# Altium footprint library sun_library.PcbLib: 412 footprints (part 14 of 26)
Each footprint in its own frame and in the unit in brackets; x right, y up, seen from the top. Pads: shape width x height; smd on the part's side, far side on the other; paste and mask are expansions set on the pad; w line width, h text height; cw(c..) or ccw(c..) is an arc to the next point about the centre after c.
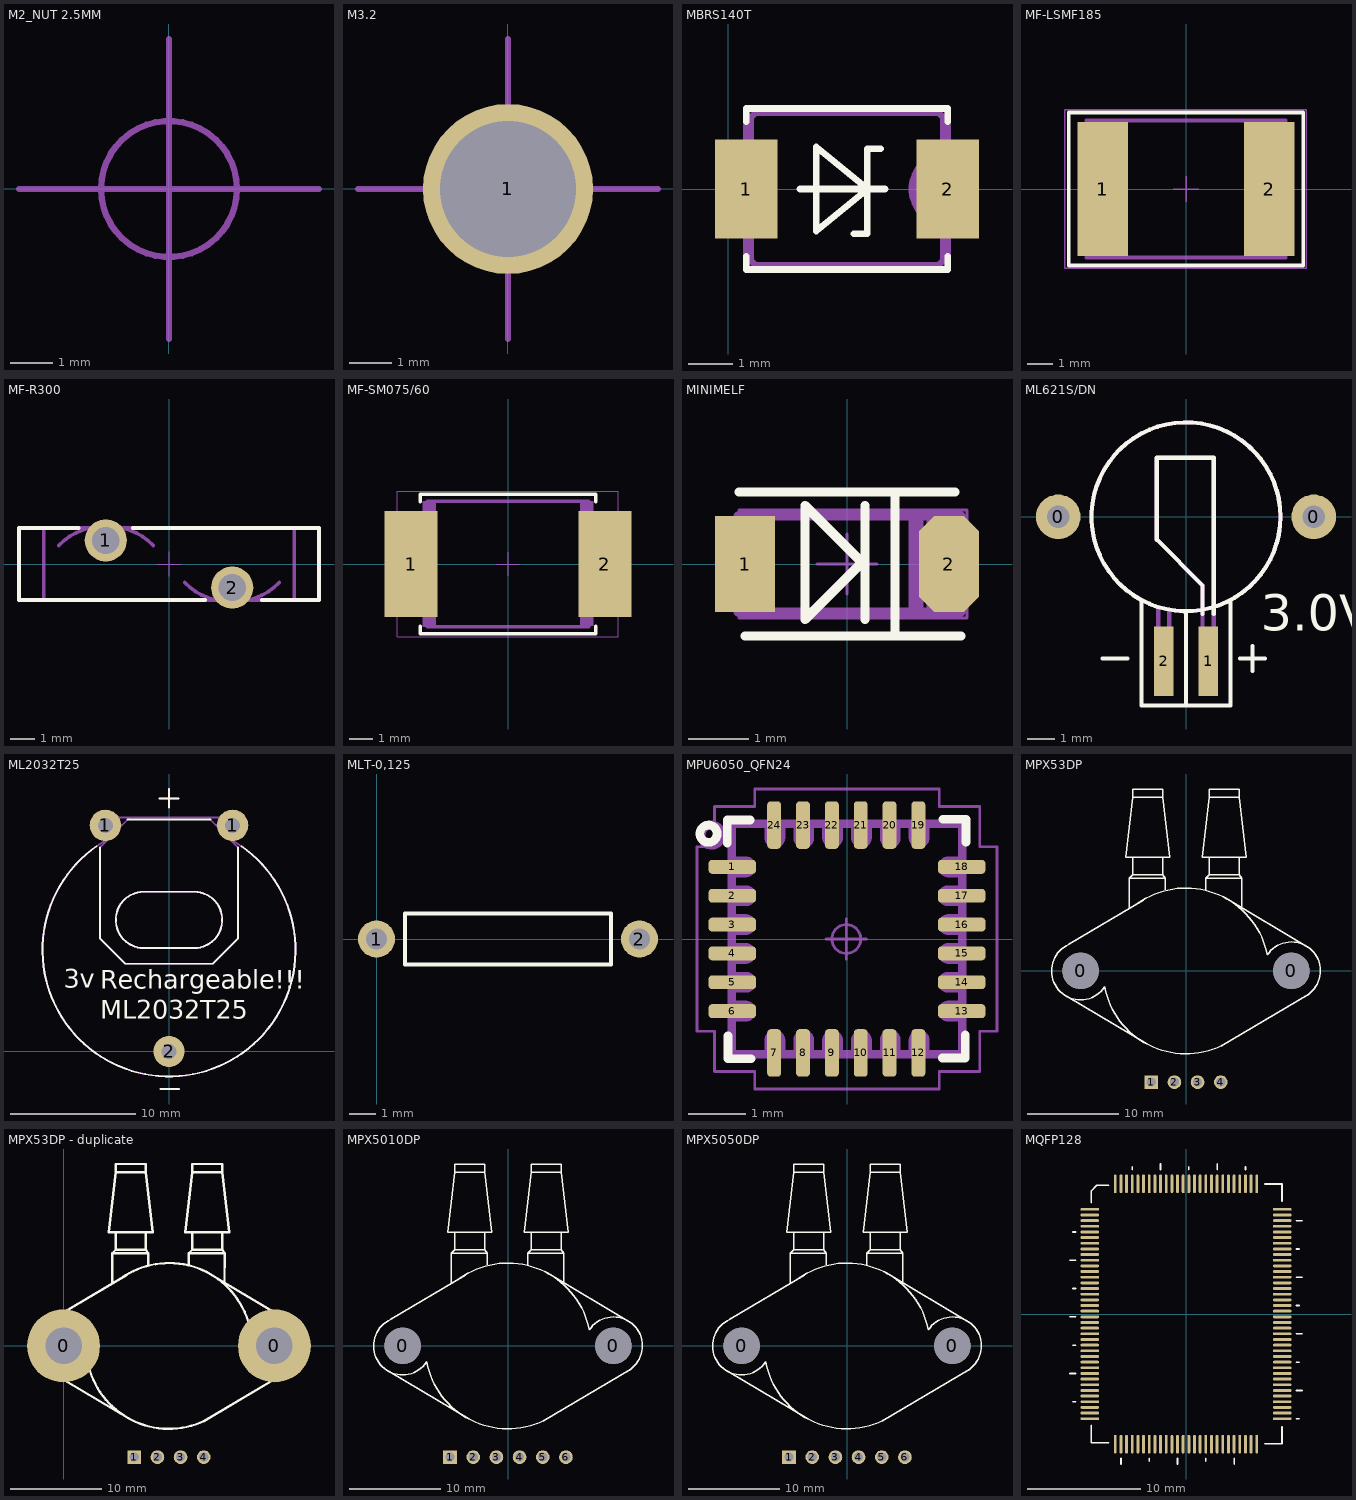
[diagram p13: the footprints below, top view; thin cyan lines are the x and y axes]

## M2_NUT 2.5MM [mm] "M2_NUT  WURTH"
height 2.5
TopAssy 13:
  circle w0.15: c0,0 r1.6
  lines w0.15: -3.529,0 3.529,0 ; 0,-3.529 0,3.529
3D body "9774025243R.stp": height 2.51, standoff -1.39, extent -2.175,-2.174 2.175,2.175

## M3.2 [mm] "m3.2"
height 5
pads (1):
  round 4 / inner round 0 / far side round 4 hole 3.2 unplated: 1(0,0)
TopAssy 13:
  circle w0.15: c0,0 r1.6
  lines w0.15: -3.529,0 3.529,0 ; 0,-3.529 0,3.529

## MBRS140T [mm]
pads (2):
  rect 1.4x2.2 smd: 1(0.4,0) 2(4.9,0)
Top Overlay:
  lines w0.15: 0.4,-1.5 0.4,-1.8 4.9,-1.8 4.9,-1.5 ; 0.4,1.5 0.4,1.8 4.9,1.8 4.9,1.5 ; 1.6,0 3.1,0 3.5,0 ; 2.8,-1 3.1,-1 3.1,0.9 3.4,0.9 ; 1.963,-0.937 1.963,0.937 3.113,0 1.963,-0.937
TopAssy 13:
  lines w0.15: 0.4,-1 0,-1 0,1 0.4,1 ; 4.8,-0.8 4.8,-1.6 4.7,-1.7 0.6,-1.7 0.5,-1.6 0.5,0 0.5,1.6 0.6,1.7 4.7,1.7 4.8,1.6 4.8,0.8 ; 4.9,-1 5.3,-1 5.3,1 4.9,1 ; 4.9,-0.8 cw(c4.9,0) 4.9,0.8 ; 4.9,-0.7 cw(c4.9,0) 4.9,0.7 ; 0.4,-1.8 4.9,-1.8 4.9,1.8 0.4,1.8 0.4,-1.8
3D body "Diode Molded Body.step": height 2.37, standoff -0.03, extent 0.05,-1.8 5.35,1.8

## MF-LSMF185 [mm] "PTC Resettable Fuses"
height 1.6
pads (2):
  rect 2x5.3 smd: 1(-3.3,0) 2(3.3,0)
Top Overlay:
  lines w0.15: -4.65,-3.03 4.65,-3.03 4.65,3.03 -4.65,3.03 -4.65,-3.03
TopAssy 13:
  rectangle: -4,-2.7 -3.41,-1.08
  rectangle: -4,1.1 -3.41,2.72
  rectangle: 3.4,-2.7 3.99,-1.08
  rectangle: 3.4,1.1 3.99,2.72
  lines w0.15: -3.95,-2.72 3.95,-2.72 ; -3.95,2.72 3.95,2.72 ; -3.745,-1.105 ccw(c-3.75,0) -3.745,1.105 ; 3.745,-1.13 cw(c3.75,-0.025) 3.745,1.08
CourtTop 15:
  lines w0.05: -0.5,0 0.5,0 ; 0,-0.5 0,0.5 ; -4.8,-3.15 -4.8,3.15 4.775,3.15 4.775,-3.15 -4.8,-3.15
3D body "MF-LSMF300-24X-2.STEP": height 1.19, standoff 0.01, extent -3.677,-2.56 3.678,2.56

## MF-R300 [mm] "MF-R Series - PTC Resettable Fuses BOURNS"
height 11.4
pads (2):
  round 1.7 hole 1.1: 1(-2.55,0.95) 2(2.55,-0.95)
Top Overlay:
  lines w0.15: -3.65,1.45 -6.05,1.45 -6.05,-1.45 1.45,-1.45 ; -1.45,1.45 6.05,1.45 6.05,-1.45 3.75,-1.45
TopAssy 13:
  lines w0.15: -4.45,0.75 cw(c-2.541,-1.159) -0.632,0.75 ; 0.632,-0.75 ccw(c2.541,1.159) 4.45,-0.75 ; -5.05,-1.45 5.05,-1.45 5.05,1.45 -5.05,1.45 -5.05,-1.45
CourtTop 15:
  lines w0.05: -0.5,0 0.5,0 ; 0,-0.5 0,0.5 ; -6.05,-1.45 6.025,-1.45 6.025,1.5 -6.05,1.5 -6.05,-1.45
3D body "User Library-MF-R250.STEP": height 18.3, standoff -7.6, extent -6.05,-1.36 5.95,1.46

## MF-SM075/60 [mm] "PTC Resettable Fuses"
height 1.6
pads (2):
  rect 2.3x4.6 smd: 1(-4.2,0) 2(4.2,0)
Top Overlay:
  lines w0.15: -3.8,-2.7 -3.8,-3.03 3.8,-3.03 3.8,-2.7 ; -3.8,2.7 -3.8,3.03 3.8,3.03 3.8,2.7
TopAssy 13:
  rectangle: 3.11,-2.68 3.7,2.72
  rectangle: -3.7,-2.72 -3.11,2.72
  lines w0.15: -3.5,-2.72 3.5,-2.72 ; -3.5,2.72 3.5,2.72
CourtTop 15:
  lines w0.05: -0.5,0 0.5,0 ; 0,-0.5 0,0.5 ; -4.8,-3.15 4.775,-3.15 4.775,3.15 -4.8,3.15 -4.8,-3.15
3D body "User Library-mf-sm075.step": height 3.19, standoff 0.01, extent -3.678,-2.8 3.678,2.64

## MINIMELF [mm] "MINIMELF(DO-213AA)(SOD-80)"
pads (2):
  rect 1x1.6 smd: 1(-1.7,0)
  oct 1x1.6 smd: 2(1.7,0)
Top Overlay:
  lines w0.15: -1.8,1.2 1.8,1.2 ; -1.7,-1.2 1.9,-1.2 ; 0.2,0.075 -0.7,0.975 -0.7,-0.925 0.3,0.075 ; 0.3,-0.925 0.3,0.975 ; 0.8,-1.1 0.8,1.2
TopAssy 13:
  lines w0.15: -1.3,-0.8 -1.3,0.8 ; 1.1,-0.8 1.1,0.8 ; 1.2,-0.8 1.2,0.8 ; 1.4,-0.8 1.4,0.8 ; -1.82,-0.8 1.9,-0.8 1.9,0.8 -1.82,0.8 -1.82,-0.8
CourtTop 15:
  lines w0.05: -0.5,0 0.5,0 ; 0,-0.5 0,0.5 ; -1.8,-0.9 2,-0.9 2,0.9 -1.8,0.9 -1.8,-0.9
3D body "User Library-MiniMelf-2.step": height 1.6, standoff 0, extent -1.82,-0.8 1.88,0.8

## ML621S/DN [mm] "Battery Panasonic 3.0V"
height 2.35
pads (4):
  round 1.6 hole 0.8: 0(-4.6,0) 0(4.6,0)
  rect 0.7x2.5 smd: 1(0.8,-5.2) 2(-0.8,-5.2)
Top Overlay:
  circle w0.15: c0,0 r3.4
  lines w0.15: -3,-5.1 -2.1,-5.1 ; -1.6,-3 -1.6,-6.8 0,-6.8 ; 0.6,-3.5 0.6,-2.475 -1.05,-0.825 -1.05,2.125 1,2.125 1,-3.5 ; 1.6,-3 1.6,-6.8 0,-6.8 ; 1.95,-5.1 2.85,-5.1 ; 2.4,-5.55 2.4,-4.65 ; 0,-6.8 0,-3.4 0,-6.8
  text "3.0V" at 2.7,-4.1 h1.3
TopAssy 13:
  circle w0.15: c0,0 r3.4
  lines w0.15: -1,-3.3 -1,-6 -0.6,-6 -0.6,-3.4 ; -1.05,-0.825 0.6,-2.475 0.6,-6 1,-6 1,2.125 -1.05,2.125 -1.05,-0.825
3D body "User Library-ms621fe.STEP": height 2.7, standoff 0, extent -3.4,-5.8 3.4,3.5

## ML2032T25 [mm] "ML2032T25 Maxell"
height 8.5
pads (3):
  round 2.5 hole 1.2: 1(-5.08,18.05) 1(5.08,18.05) 2(0,0)
Top Overlay:
  lines w0.15: -5.785,16.379 ccw(c0,8.1) 5.785,16.379 ; -5.5,16.3 -5.5,9 -3.5,7 3.5,7 5.5,9 5.5,16.3 ; -3.3,18.5 3.3,18.5 ; -0.75,20.2 0.75,20.2 ; -0.7,-3 0.8,-3 ; 0,19.45 0,20.95 ; -2,8.25 cw(c-2,10.5) -2,12.75 2,12.75 cw(c2,10.5) 2,8.25 -2,8.25
  text "Rechargeable!!!" at -5.5,5 h1.5
  text "ML2032T25" at -5.5,2.6 h1.5
  text "3v" at -8.4,5.1 h1.5
TopAssy 13:
  circle w0.15: c5.08,18.05 r0.625
  circle w0.15: c-5.08,18.05 r0.603
  circle w0.15: c0,0 r0.52
  lines w0.15: -4.793,16.99 ccw(c0,8.1) 4.819,16.976 ; -3.75,18.075 -5.075,18.075 -5.075,18.1 -5.125,18.1 -5.125,18.675 5.075,18.675 5.075,18.075 3.7,18.075 ; -3.125,18.675 -5.5,16.3 -5.5,9 -3.5,7 3.5,7 5.5,9 5.5,16.3 3.125,18.675 ; -0.75,20.2 0.75,20.2 ; -0.7,-3 0.8,-3 ; 0,19.45 0,20.95 ; -2,8.25 cw(c-2,10.5) -2,12.75 2,12.75 cw(c2,10.5) 2,8.25 -2,8.25
3D body "User Library-cr2032 pcb, lithium battery-1.step": height 6.75, standoff -4.47, extent -10,-2.1 10,18.149

## MLT-0,125 [mm]
pads (2):
  round 1.41 hole 0.8: 1(0,0) 2(10,0)
Top Overlay:
  lines w0.15: 1.085,0.973 1.085,-0.976 8.915,-0.976 8.915,0.976 1.085,0.976

## MPU6050_QFN24 [mm] "Quad Flat No-Lead (QFN with Tab), 0.50 mm pitch; square, 6 pin X 6 pin, 4.00 mm L X 4.00 mm W X 0.9 mm H body"
height 0.9
pads (24):
  rrect52% 0.825x0.24 smd mask+0.05: 1(-1.987,1.25) 2(-1.987,0.75) 3(-1.987,0.25) 4(-1.987,-0.25) 5(-1.987,-0.75) 6(-1.987,-1.25) 13(1.988,-1.25) 14(1.988,-0.75) 15(1.988,-0.25) 16(1.988,0.25) 17(1.988,0.75) 18(1.988,1.25)
  rrect52% 0.24x0.825 smd mask+0.05: 7(-1.263,-1.975) 8(-0.763,-1.975) 9(-0.262,-1.975) 10(0.237,-1.975) 11(0.737,-1.975) 12(1.238,-1.975) 19(1.238,1.975) 20(0.737,1.975) 21(0.238,1.975) 22(-0.263,1.975) 23(-0.763,1.975) 24(-1.262,1.975)
Top Overlay:
  circle w0.15: c-2.4,1.825 r0.15
  lines w0.15: -2.075,1.663 -2.075,2.063 -1.675,2.063 ; -2.063,-1.675 -2.063,-2.075 -1.663,-2.075 ; 1.65,-2.063 2.05,-2.063 2.05,-1.663 ; 1.663,2.075 2.063,2.075 2.063,1.675
TopAssy 13:
  circle w0.15: c-2.35,1.8 r0.177
  lines w0.15: -2,-2 -2,2 2,2 2,-2 -2,-2 ; -2,-1.355 -1.755,-1.355 ccw(c-1.755,-1.25) -1.755,-1.145 -2,-1.145 -2,-1.355 ; -2,-0.855 -1.755,-0.855 ccw(c-1.755,-0.75) -1.755,-0.645 -2,-0.645 -2,-0.855 ; -2,-0.355 -1.755,-0.355 ccw(c-1.755,-0.25) -1.755,-0.145 -2,-0.145 -2,-0.355 ; -2,0.145 -1.755,0.145 ccw(c-1.755,0.25) -1.755,0.355 -2,0.355 -2,0.145 ; -2,0.645 -1.755,0.645 ccw(c-1.755,0.75) -1.755,0.855 -2,0.855 -2,0.645 ; -2,1.145 -1.755,1.145 ccw(c-1.755,1.25) -1.755,1.355 -2,1.355 -2,1.145 ; -1.355,-2 -1.145,-2 -1.145,-1.755 ccw(c-1.25,-1.755) -1.355,-1.755 -1.355,-2 ; -1.355,1.755 ccw(c-1.25,1.755) -1.145,1.755 -1.145,2 -1.355,2 -1.355,1.755 ; -0.855,-2 -0.645,-2 -0.645,-1.755 ccw(c-0.75,-1.755) -0.855,-1.755 -0.855,-2 ; -0.855,1.755 ccw(c-0.75,1.755) -0.645,1.755 -0.645,2 -0.855,2 -0.855,1.755 ; -0.355,-2 -0.145,-2 -0.145,-1.755 ccw(c-0.25,-1.755) -0.355,-1.755 -0.355,-2 ; -0.355,1.755 ccw(c-0.25,1.755) -0.145,1.755 -0.145,2 -0.355,2 -0.355,1.755 ; 0.145,-2 0.355,-2 0.355,-1.755 ccw(c0.25,-1.755) 0.145,-1.755 0.145,-2 ; 0.145,1.755 ccw(c0.25,1.755) 0.355,1.755 0.355,2 0.145,2 0.145,1.755 ; 0.645,-2 0.855,-2 0.855,-1.755 ccw(c0.75,-1.755) 0.645,-1.755 0.645,-2 ; 0.645,1.755 ccw(c0.75,1.755) 0.855,1.755 0.855,2 0.645,2 0.645,1.755 ; 1.145,-2 1.355,-2 1.355,-1.755 ccw(c1.25,-1.755) 1.145,-1.755 1.145,-2 ; 1.145,1.755 ccw(c1.25,1.755) 1.355,1.755 1.355,2 1.145,2 1.145,1.755 ; 1.755,-1.355 cw(c1.755,-1.25) 1.755,-1.145 2,-1.145 2,-1.355 1.755,-1.355 ; 1.755,-0.855 cw(c1.755,-0.75) 1.755,-0.645 2,-0.645 2,-0.855 1.755,-0.855 ; 1.755,-0.355 cw(c1.755,-0.25) 1.755,-0.145 2,-0.145 2,-0.355 1.755,-0.355 ; 1.755,0.145 cw(c1.755,0.25) 1.755,0.355 2,0.355 2,0.145 1.755,0.145 ; 1.755,0.645 cw(c1.755,0.75) 1.755,0.855 2,0.855 2,0.645 1.755,0.645 ; 1.755,1.145 cw(c1.755,1.25) 1.755,1.355 2,1.355 2,1.145 1.755,1.145
CourtTop 15:
  circle w0.05: c-0.012,0 r0.25
  lines w0.05: -0.362,0 0.337,0 ; -0.012,-0.35 -0.012,0.35 ; -2.6,-1.6 -2.6,1.6 -2.3,1.6 -2.3,2.3 -1.6,2.3 -1.6,2.6 1.6,2.6 1.6,2.3 2.3,2.3 2.3,1.6 2.6,1.6 2.6,-1.6 2.3,-1.6 2.3,-2.3 1.6,-2.3 1.6,-2.6 -1.6,-2.6 -1.6,-2.3 -2.3,-2.3 -2.3,-1.6 -2.6,-1.6
3D body "User Library-mpu-6050_qfn-24-1.step": height 0.88, standoff -0.02, extent -2.04,-2.02 2,2.02

## MPX53DP [mm] "Integrated Silicon Pressure Sensor for SIP panel"
height 11.05
pads (6):
  round 4 hole 4: 0(-11.557,0) 0(11.557,0)
  rect 1.5x1.5 hole 1: 1(-3.81,-12.192)
  round 1.5 hole 1: 2(-1.27,-12.192) 3(1.27,-12.192) 4(3.81,-12.192)
Top Overlay:
  lines w0.15: -13.081,-2.794 -4.318,-8.001 ; -12.827,2.921 -4.699,7.747 ; -12.823,2.912 ccw(c-11.557,0) -8.915,-1.761 ccw(c0,0) 3.875,-8.22 ; -6.223,6.854 -6.223,8.89 -6.223,10.16 ; -5.842,12.446 -5.842,10.541 ; -5.27,7.403 cw(c0,0) 8.915,1.761 cw(c11.557,0) 13.387,-2.595 ; -2.54,12.446 -2.54,10.541 ; -2.286,8.89 -2.286,10.16 ; 2.159,8.89 2.159,10.16 ; 2.54,12.446 2.54,10.541 ; 3.81,-8.255 13.462,-2.54 ; 4.318,8.001 13.462,2.54 ; 5.842,12.446 5.842,10.541 ; 6.092,6.942 6.096,10.16 ; -6.223,10.16 -2.286,10.16 ; -6.223,10.16 -5.842,10.541 ; -5.842,10.541 -2.54,10.541 ; -5.842,19.05 -6.604,12.446 -1.778,12.446 -2.54,19.05 ; -5.842,19.05 -2.54,19.05 ; -5.842,19.05 -5.842,19.939 -2.54,19.939 -2.54,19.05 ; -2.54,10.541 -2.286,10.16 ; 2.159,10.16 2.54,10.541 ; 2.159,10.16 6.096,10.16 ; 2.54,10.541 5.842,10.541 ; 2.54,19.05 2.54,19.939 5.842,19.939 5.842,19.05 ; 2.54,19.05 5.842,19.05 ; 2.54,19.05 1.778,12.446 6.604,12.446 5.842,19.05 ; 5.842,10.541 6.096,10.16
3D body "MPX53DP_Выводы загнуты.STEP": height 11.7, standoff 0, extent -14.925,-12.397 14.925,22.038

## MPX53DP - duplicate [mm] "Integrated Silicon Pressure Sensor for SIP panel"
height 11.05
pads (6):
  round 8 hole 4: 0(0,0) 0(23.114,0)
  rect 1.5x1.5 hole 1: 1(7.747,-12.192)
  round 1.5 hole 1: 2(10.287,-12.192) 3(12.827,-12.192) 4(15.367,-12.192)
Top Overlay:
  lines w0.254: -1.524,-2.794 7.239,-8.001 ; -1.27,2.921 6.858,7.747 ; -1.266,2.912 ccw(c0,0) 2.642,-1.761 ccw(c11.557,0) 15.432,-8.22 ; 5.334,6.854 5.334,8.89 5.334,10.16 ; 5.715,12.446 5.715,10.541 ; 6.287,7.403 cw(c11.557,0) 20.472,1.761 cw(c23.114,0) 24.944,-2.595 ; 9.017,12.446 9.017,10.541 ; 9.271,8.89 9.271,10.16 ; 13.716,8.89 13.716,10.16 ; 14.097,12.446 14.097,10.541 ; 15.367,-8.255 25.019,-2.54 ; 15.875,8.001 25.019,2.54 ; 17.399,12.446 17.399,10.541 ; 17.649,6.942 17.653,10.16 ; 5.334,10.16 9.271,10.16 ; 5.334,10.16 5.715,10.541 ; 5.715,10.541 9.017,10.541 ; 5.715,19.05 4.953,12.446 9.779,12.446 9.017,19.05 ; 5.715,19.05 9.017,19.05 ; 5.715,19.05 5.715,19.939 9.017,19.939 9.017,19.05 ; 9.017,10.541 9.271,10.16 ; 13.716,10.16 14.097,10.541 ; 13.716,10.16 17.653,10.16 ; 14.097,10.541 17.399,10.541 ; 14.097,19.05 14.097,19.939 17.399,19.939 17.399,19.05 ; 14.097,19.05 17.399,19.05 ; 14.097,19.05 13.335,12.446 18.161,12.446 17.399,19.05 ; 17.399,10.541 17.653,10.16
3D body "MPX53DP_Выводы загнуты.STEP": height 11.7, standoff 0, extent -3.37,-14.175 26.48,20.26

## MPX5010DP [mm] "Integrated Silicon Pressure Sensor for SIP panel"
height 11.05
pads (8):
  round 4 hole 4: 0(-11.557,0) 0(11.557,0)
  rect 1.5x1.5 hole 1: 1(-6.35,-12.192)
  round 1.5 hole 1: 2(-3.81,-12.192) 3(-1.27,-12.192) 4(1.27,-12.192) 5(3.81,-12.192) 6(6.35,-12.192)
Top Overlay:
  lines w0.15: -13.081,-2.794 -4.318,-8.001 ; -12.827,2.921 -4.699,7.747 ; -12.823,2.912 ccw(c-11.557,0) -8.915,-1.761 ccw(c0,0) 3.875,-8.22 ; -6.223,6.854 -6.223,8.89 -6.223,10.16 ; -5.842,12.446 -5.842,10.541 ; -5.27,7.403 cw(c0,0) 8.915,1.761 cw(c11.557,0) 13.387,-2.595 ; -2.54,12.446 -2.54,10.541 ; -2.286,8.89 -2.286,10.16 ; 2.159,8.89 2.159,10.16 ; 2.54,12.446 2.54,10.541 ; 3.81,-8.255 13.462,-2.54 ; 4.318,8.001 13.462,2.54 ; 5.842,12.446 5.842,10.541 ; 6.092,6.942 6.096,10.16 ; -6.223,10.16 -5.842,10.541 ; -6.223,10.16 -2.286,10.16 ; -5.842,10.541 -2.54,10.541 ; -5.842,19.05 -5.842,19.939 -2.54,19.939 -2.54,19.05 ; -5.842,19.05 -2.54,19.05 ; -5.842,19.05 -6.604,12.446 -1.778,12.446 -2.54,19.05 ; -2.54,10.541 -2.286,10.16 ; 2.159,10.16 6.096,10.16 ; 2.159,10.16 2.54,10.541 ; 2.54,10.541 5.842,10.541 ; 2.54,19.05 1.778,12.446 6.604,12.446 5.842,19.05 ; 2.54,19.05 5.842,19.05 ; 2.54,19.05 2.54,19.939 5.842,19.939 5.842,19.05 ; 5.842,10.541 6.096,10.16
3D body "MPX5010DP--3DModel-STEP-56544_new3.STEP": height 11.63, standoff -0.72, extent -14.73,-12.392 14.735,20.261

## MPX5050DP [mm] "Integrated Silicon Pressure Sensor"
height 11.05
pads (8):
  round 4 hole 4: 0(-11.557,0) 0(11.557,0)
  rect 1.5x1.5 hole 1: 1(-6.35,-12.192)
  round 1.5 hole 1: 2(-3.81,-12.192) 3(-1.27,-12.192) 4(1.27,-12.192) 5(3.81,-12.192) 6(6.35,-12.192)
Top Overlay:
  lines w0.15: -13.081,-2.794 -4.318,-8.001 ; -12.827,2.921 -4.699,7.747 ; -12.823,2.912 ccw(c-11.557,0) -8.915,-1.761 ccw(c0,0) 3.875,-8.22 ; -6.223,6.854 -6.223,8.89 -6.223,10.16 ; -5.842,12.446 -5.842,10.541 ; -5.27,7.403 cw(c0,0) 8.915,1.761 cw(c11.557,0) 13.387,-2.595 ; -2.54,12.446 -2.54,10.541 ; -2.286,8.89 -2.286,10.16 ; 2.159,8.89 2.159,10.16 ; 2.54,12.446 2.54,10.541 ; 3.81,-8.255 13.462,-2.54 ; 4.318,8.001 13.462,2.54 ; 5.842,12.446 5.842,10.541 ; 6.092,6.942 6.096,10.16 ; -6.223,10.16 -5.842,10.541 ; -6.223,10.16 -2.286,10.16 ; -5.842,10.541 -2.54,10.541 ; -5.842,19.05 -5.842,19.939 -2.54,19.939 -2.54,19.05 ; -5.842,19.05 -2.54,19.05 ; -5.842,19.05 -6.604,12.446 -1.778,12.446 -2.54,19.05 ; -2.54,10.541 -2.286,10.16 ; 2.159,10.16 6.096,10.16 ; 2.159,10.16 2.54,10.541 ; 2.54,10.541 5.842,10.541 ; 2.54,19.05 1.778,12.446 6.604,12.446 5.842,19.05 ; 2.54,19.05 5.842,19.05 ; 2.54,19.05 2.54,19.939 5.842,19.939 5.842,19.05 ; 5.842,10.541 6.096,10.16
3D body "MPX5010DP--3DModel-STEP-56544_new3.STEP": height 11.63, standoff -0.72, extent -14.73,-12.392 14.735,20.261

## MQFP128 [mil]
pads (128):
  oval 65x10 smd mask+2.95: 1(-334.65,364.17) 2(-334.65,344.49) 3(-334.65,324.8) 4(-334.65,305.12) 5(-334.65,285.43) 6(-334.65,265.75) 7(-334.65,246.06) 8(-334.65,226.38) 9(-334.65,206.69) 10(-334.65,187.01) 11(-334.65,167.32) 12(-334.65,147.65) 13(-334.65,127.95) 14(-334.65,108.25) 15(-334.65,88.58) 16(-334.65,68.9) 17(-334.65,49.21) 18(-334.65,29.53) 19(-334.65,9.84) 20(-334.65,-9.84) 21(-334.65,-29.53) 22(-334.65,-49.21) 23(-334.65,-68.9) 24(-334.65,-88.58) 25(-334.65,-108.27) 26(-334.65,-127.95) 27(-334.65,-147.64) 28(-334.65,-167.32) 29(-334.65,-187.01) 30(-334.65,-206.69) 31(-334.65,-226.38) 32(-334.65,-246.06) 33(-334.65,-265.75) 34(-334.65,-285.43) 35(-334.65,-305.12) 36(-334.65,-324.8) 37(-334.65,-344.49) 38(-334.65,-364.17) 65(334.65,-364.17) 66(334.65,-344.49) 67(334.65,-324.8) 68(334.65,-305.12) 69(334.65,-285.43) 70(334.65,-265.75) 71(334.65,-246.06) 72(334.65,-226.38) 73(334.65,-206.69) 74(334.65,-187.02) 75(334.65,-167.32) 76(334.65,-147.64) 77(334.65,-127.95) 78(334.65,-108.27) 79(334.65,-88.58) 80(334.65,-68.9) 81(334.65,-49.21) 82(334.65,-29.53) 83(334.65,-9.84) 84(334.65,9.84) 85(334.65,29.53) 86(334.65,49.21) 87(334.65,68.9) 88(334.65,88.58) 89(334.65,108.27) 90(334.65,127.95) 91(334.65,147.64) 92(334.65,167.32) 93(334.65,187.01) 94(334.65,206.69) 95(334.65,226.38) 96(334.65,246.06) 97(334.65,265.75) 98(334.65,285.43) 99(334.65,305.12) 100(334.65,324.8) 101(334.65,344.49) 102(334.65,364.17)
  oval 10x65 smd mask+2.95: 39(-246.06,-452.76) 40(-226.38,-452.76) 41(-206.69,-452.76) 42(-187.01,-452.76) 43(-167.32,-452.76) 44(-147.64,-452.76) 45(-127.95,-452.76) 46(-108.27,-452.76) 47(-88.58,-452.76) 48(-68.9,-452.76) 49(-49.23,-452.76) 50(-29.53,-452.76) 51(-9.84,-452.76) 52(9.84,-452.76) 53(29.53,-452.76) 54(49.21,-452.76) 55(68.9,-452.76) 56(88.58,-452.76) 57(108.27,-452.76) 58(127.95,-452.76) 59(147.64,-452.76) 60(167.32,-452.76) 61(187.01,-452.76) 62(206.69,-452.76) 63(226.38,-452.76) 64(246.06,-452.76) 103(246.06,452.76) 104(226.38,452.76) 105(206.69,452.76) 106(187.01,452.76) 107(167.32,452.76) 108(147.64,452.76) 109(127.95,452.76) 110(108.27,452.76) 111(88.58,452.76) 112(68.9,452.76) 113(49.21,452.76) 114(29.53,452.76) 115(9.84,452.76) 116(-9.84,452.76) 117(-29.53,452.76) 118(-49.21,452.76) 119(-68.9,452.76) 120(-88.58,452.76) 121(-108.27,452.76) 122(-127.95,452.76) 123(-147.64,452.76) 124(-167.32,452.76) 125(-187.01,452.76) 126(-206.69,452.76) 127(-226.38,452.76) 128(-246.06,452.76)
Top Overlay:
  lines w5.91: -403.54,-206.69 -383.86,-206.69 ; -403.54,-9.84 -383.86,-9.84 ; -403.54,187.01 -383.86,187.01 ; -393.7,-305.12 -383.86,-305.12 ; -393.7,-108.27 -383.86,-108.27 ; -393.7,88.58 -383.86,88.58 ; -393.7,285.43 -383.86,285.43 ; -329.84,-387.95 -329.84,-447.95 -269.84,-447.95 ; -329.84,387.95 -329.84,427.95 -309.84,447.95 -269.84,447.95 ; -226.38,-521.65 -226.38,-501.97 ; -187.01,501.97 -187.01,511.81 ; -127.95,-511.81 -127.95,-501.97 ; -88.58,501.97 -88.58,521.65 ; -29.53,-521.65 -29.53,-501.97 ; 9.84,501.97 9.84,511.81 ; 68.9,-511.81 68.9,-501.97 ; 108.27,501.97 108.27,521.65 ; 167.32,-521.65 167.32,-501.97 ; 206.69,501.97 206.69,511.81 ; 273.62,-450.79 333.62,-450.79 333.62,-391.89 ; 273.78,451.89 333.78,451.89 333.78,391.89 ; 383.86,-364.17 393.7,-364.17 ; 383.86,-265.75 403.54,-265.75 ; 383.86,-167.32 393.7,-167.32 ; 383.86,-68.9 403.54,-68.9 ; 383.86,29.53 393.7,29.53 ; 383.86,127.95 403.54,127.95 ; 383.86,226.38 393.7,226.38 ; 383.86,324.8 403.54,324.8
3D body "SW3dPS-PQFP128.STEP": height 111.13, standoff -2.45, extent -338.63,-456.77 338.62,456.7